# Altium footprint library PcbLib.PcbLib: 68 footprints (part 1 of 5)
Each footprint in its own frame and in the unit in brackets; x right, y up, seen from the top. Pads: shape width x height; smd on the part's side, far side on the other; paste and mask are expansions set on the pad; w line width, h text height; cw(c..) or ccw(c..) is an arc to the next point about the centre after c.
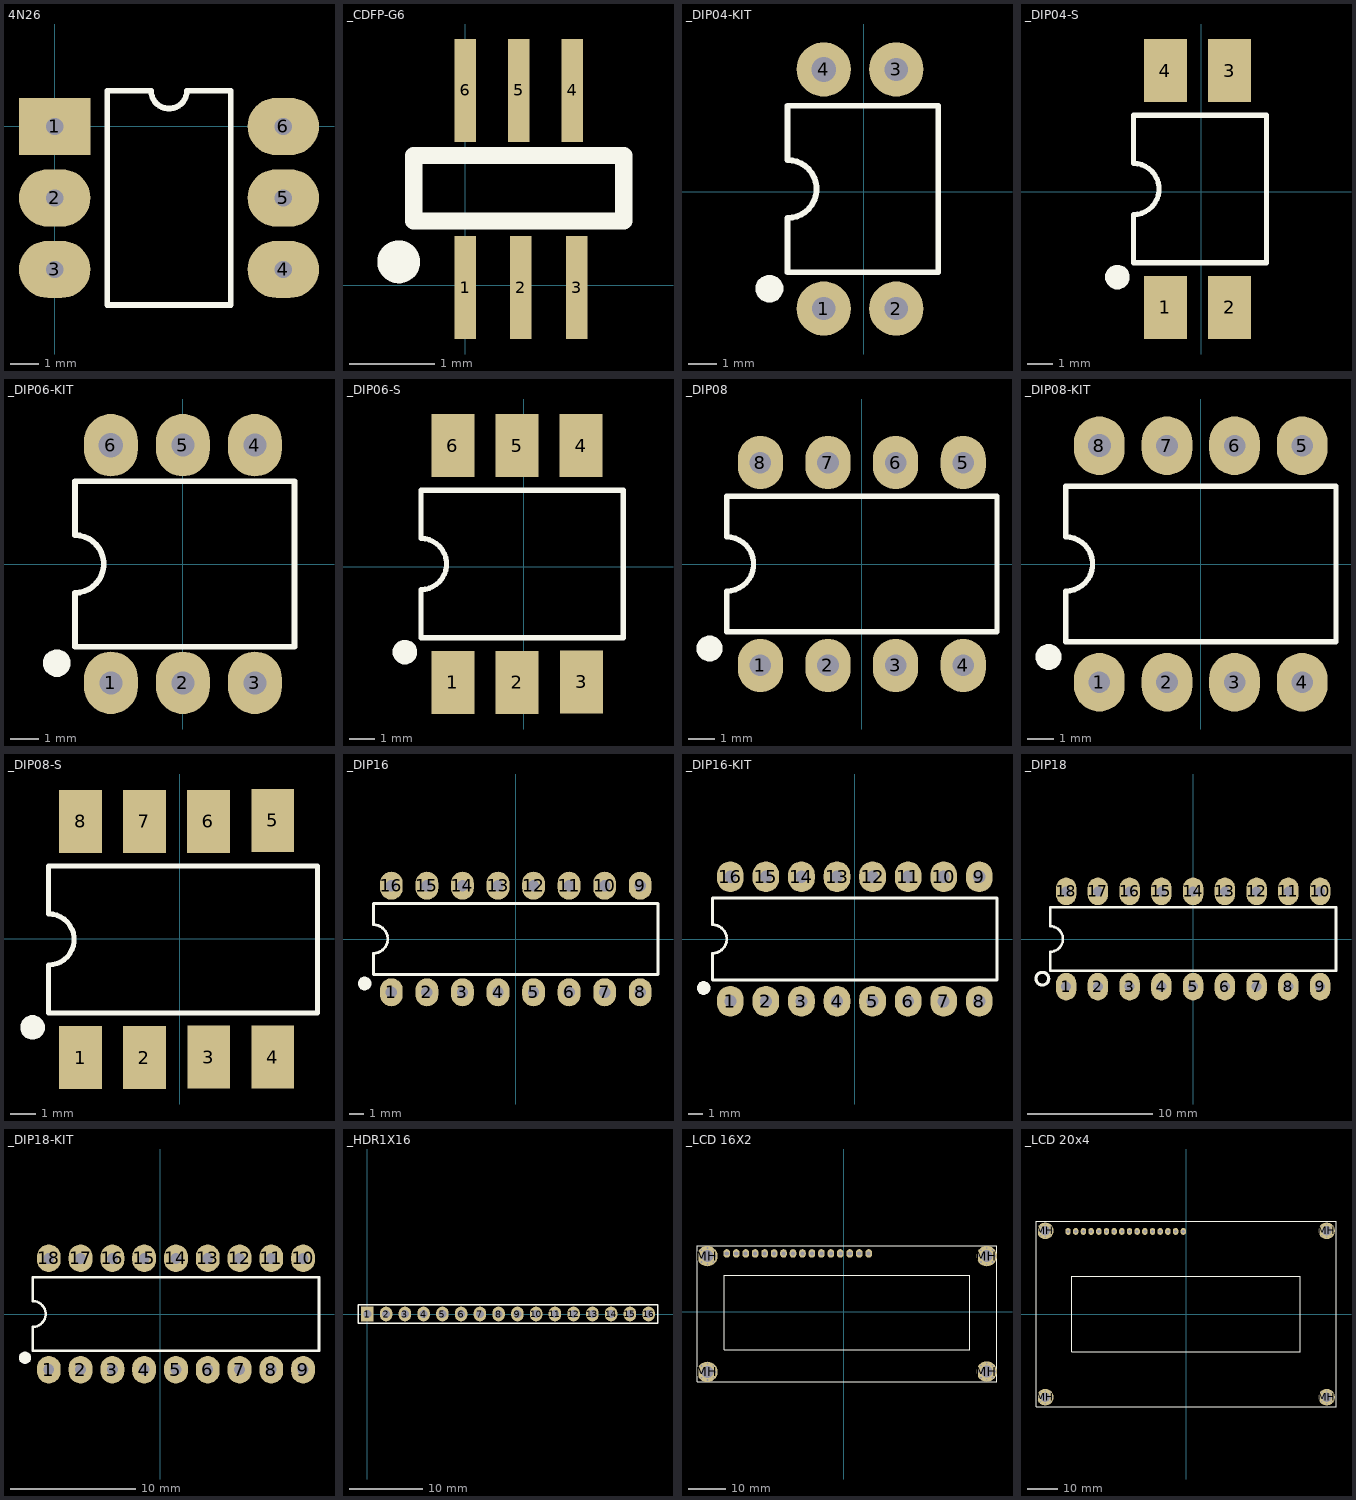
[diagram p0: the footprints below, top view; thin cyan lines are the x and y axes]

## 4N26 [mm]
pads (6):
  rect 2.5x2 hole 0.6: 1(0,0)
  oval 2.5x2 hole 0.6: 2(0,-2.5) 3(0,-5) 4(8,-5) 5(8,-2.5) 6(8,0)
Top Overlay:
  lines w0.2: 1.835,-6.25 1.835,1.25 3.375,1.25 ccw(c4,1.25) 4.625,1.25 6.165,1.25 6.165,-6.25 1.835,-6.25

## _CDFP-G6 [mm] "DFP; 6 Leads; Body 3.7 x 3.6 mm (LxW max); Pitch 1.27 mm"
height 1.8
pads (6):
  rect 0.25x1.2 smd: 1(0,-0.025) 2(0.65,-0.025) 3(1.3,-0.025) 4(1.25,2.275) 5(0.625,2.275) 6(0,2.275)
Top Overlay:
  circle w0.25: c-0.775,0.275 r0.125
  lines w0.2: -0.6,1.083 -0.6,1.516 1.85,1.516 1.85,0.75 -0.6,0.75 -0.6,1.225

## _DIP04-KIT [mm]
pads (4):
  round 1.905 hole 0.813: 1(-1.41,-4.091) 2(1.13,-4.091) 3(1.13,4.291)
  round 1.905 hole 0.864: 4(-1.41,4.291)
Top Overlay:
  region: -3.791,-3.393 -3.791,-3.298 -3.719,-3.123 -3.585,-2.989 -3.41,-2.916 -3.315,-2.916 -3.22,-2.916 -3.045,-2.989 -2.911,-3.123 -2.839,-3.298 -2.839,-3.393 -2.839,-3.487 -2.911,-3.662 -3.045,-3.796 -3.22,-3.869 -3.315,-3.869 -3.41,-3.869 -3.585,-3.796 -3.719,-3.662 -3.791,-3.487
  lines w0.203: -2.68,-2.821 2.6,-2.821 2.6,3.021 -2.68,3.021 -2.68,1.116 cw(c-2.68,0.1) -2.68,-0.916 -2.68,-2.821
Top Solder:
  circle w0: c1.13,-4.091 r0.432
  circle w0: c-1.41,-4.091 r0.432
  circle w0: c1.13,4.291 r0.432
  circle w0: c-1.41,4.291 r0.432
Bottom Solder:
  circle w0: c1.13,-4.091 r1.067
  circle w0: c-1.41,-4.091 r1.067
  circle w0: c1.13,4.291 r1.067
  circle w0: c-1.41,4.291 r1.067

## _DIP04-S [mm]
pads (4):
  rect 1.7x2.5 smd: 1(-1.41,-4.591) 2(1.13,-4.591) 3(1.13,4.791) 4(-1.41,4.791)
Top Overlay:
  region: -3.791,-3.393 -3.791,-3.298 -3.719,-3.123 -3.585,-2.989 -3.41,-2.916 -3.315,-2.916 -3.22,-2.916 -3.045,-2.989 -2.911,-3.123 -2.839,-3.298 -2.839,-3.393 -2.839,-3.487 -2.911,-3.662 -3.045,-3.796 -3.22,-3.869 -3.315,-3.869 -3.41,-3.869 -3.585,-3.796 -3.719,-3.662 -3.791,-3.487
  lines w0.203: -2.68,-2.821 -2.68,-0.916 ccw(c-2.68,0.1) -2.68,1.116 -2.68,3.021 2.6,3.021 2.6,-2.821 -2.68,-2.821
Top Solder:
  circle w0: c-1.41,4.791 r0.432
  circle w0: c1.13,4.791 r0.432
  circle w0: c-1.41,-4.591 r0.432
  circle w0: c1.13,-4.591 r0.432

## _DIP06-KIT [mil]
pads (6):
  oval 75x86.61 hole 32: 1(-100,-165) 2(0,-165) 3(100,-165) 4(100,165) 5(0,165)
  oval 75x86.61 hole 34: 6(-100,165)
Top Overlay:
  region: -193.75,-137.5 -193.75,-133.77 -190.9,-126.88 -185.62,-121.6 -178.73,-118.75 -175,-118.75 -171.27,-118.75 -164.38,-121.6 -159.1,-126.88 -156.25,-133.77 -156.25,-137.5 -156.25,-141.23 -159.1,-148.12 -164.38,-153.4 -171.27,-156.25 -175,-156.25 -178.73,-156.25 -185.62,-153.4 -190.9,-148.12 -193.75,-141.23
  lines w8: -150,-115 155,-115 155,115 -150,115 -150,40 cw(c-150,0) -150,-40 -150,-115
Top Solder:
  circle w0: c100,-165 r17
  circle w0: c0,-165 r17
  circle w0: c-100,-165 r17
  circle w0: c100,165 r17
  circle w0: c0,165 r17
  circle w0: c-100,165 r17
Bottom Solder:
  circle w0: c100,-165 r42
  circle w0: c0,-165 r42
  circle w0: c-100,-165 r42
  circle w0: c100,165 r42
  circle w0: c0,165 r42
  circle w0: c-100,165 r42

## _DIP06-S [mm]
pads (6):
  rect 1.7x2.5 smd: 1(-2.807,-4.591) 2(-0.267,-4.591) 3(2.286,-4.572) 4(2.273,4.791) 5(-0.267,4.791) 6(-2.807,4.791)
Top Overlay:
  region: -5.188,-3.393 -5.188,-3.298 -5.116,-3.123 -4.982,-2.989 -4.807,-2.916 -4.712,-2.916 -4.617,-2.916 -4.442,-2.989 -4.308,-3.123 -4.236,-3.298 -4.236,-3.393 -4.236,-3.487 -4.308,-3.662 -4.442,-3.796 -4.617,-3.869 -4.712,-3.869 -4.807,-3.869 -4.982,-3.796 -5.116,-3.662 -5.188,-3.487
  lines w0.203: -4.077,-2.821 3.937,-2.821 3.937,3.021 -4.077,3.021 -4.077,1.116 cw(c-4.077,0.1) -4.077,-0.916 -4.077,-2.821
Top Solder:
  circle w0: c-0.267,-4.591 r0.432
  circle w0: c-2.807,-4.591 r0.432
  circle w0: c-0.267,4.791 r0.432
  circle w0: c-2.807,4.791 r0.432

## _DIP08 [mm]
pads (8):
  oval 1.7x2 hole 0.813: 1(-3.81,-3.81) 2(-1.27,-3.81) 3(1.27,-3.81) 4(3.81,-3.81) 5(3.81,3.81) 6(1.27,3.81) 7(-1.27,3.81) 8(-3.81,3.81)
Top Overlay:
  region: -6.191,-3.175 -6.191,-3.08 -6.119,-2.905 -5.985,-2.771 -5.81,-2.699 -5.715,-2.699 -5.62,-2.699 -5.445,-2.771 -5.311,-2.905 -5.239,-3.08 -5.239,-3.175 -5.239,-3.27 -5.311,-3.445 -5.445,-3.579 -5.62,-3.651 -5.715,-3.651 -5.81,-3.651 -5.985,-3.579 -6.119,-3.445 -6.191,-3.27
  lines w0.203: -5.08,-2.54 5.08,-2.54 5.08,2.54 -5.08,2.54 -5.08,1.016 cw(c-5.08,0) -5.08,-1.016 -5.08,-2.54

## _DIP08-KIT [mm]
pads (8):
  oval 1.905x2.2 hole 0.813: 1(-3.81,-4.445) 2(-1.27,-4.445) 3(1.27,-4.445) 4(3.81,-4.445) 5(3.81,4.445) 6(1.27,4.445) 7(-1.27,4.445)
  oval 1.905x2.2 hole 0.864: 8(-3.81,4.445)
Top Overlay:
  region: -6.191,-3.492 -6.191,-3.398 -6.119,-3.223 -5.985,-3.089 -5.81,-3.016 -5.715,-3.016 -5.62,-3.016 -5.445,-3.089 -5.311,-3.223 -5.239,-3.398 -5.239,-3.492 -5.239,-3.587 -5.311,-3.762 -5.445,-3.896 -5.62,-3.969 -5.715,-3.969 -5.81,-3.969 -5.985,-3.896 -6.119,-3.762 -6.191,-3.587
  lines w0.203: -5.08,-2.921 5.08,-2.921 5.08,2.921 -5.08,2.921 -5.08,1.016 cw(c-5.08,0) -5.08,-1.016 -5.08,-2.921
Top Solder:
  circle w0: c3.81,-4.445 r0.432
  circle w0: c1.27,-4.445 r0.432
  circle w0: c-1.27,-4.445 r0.432
  circle w0: c-3.81,-4.445 r0.432
  circle w0: c3.81,4.445 r0.432
  circle w0: c1.27,4.445 r0.432
  circle w0: c-1.27,4.445 r0.432
  circle w0: c-3.81,4.445 r0.432
Bottom Solder:
  circle w0: c3.81,-4.445 r1.067
  circle w0: c1.27,-4.445 r1.067
  circle w0: c-1.27,-4.445 r1.067
  circle w0: c-3.81,-4.445 r1.067
  circle w0: c3.81,4.445 r1.067
  circle w0: c1.27,4.445 r1.067
  circle w0: c-1.27,4.445 r1.067
  circle w0: c-3.81,4.445 r1.067

## _DIP08-S [mm]
pads (8):
  rect 1.7x2.5 smd: 1(-3.95,-4.718) 2(-1.41,-4.718) 3(1.143,-4.699) 4(3.683,-4.699) 5(3.683,4.699) 6(1.13,4.664) 7(-1.41,4.664) 8(-3.95,4.664)
Top Overlay:
  region: -6.331,-3.52 -6.331,-3.425 -6.259,-3.25 -6.125,-3.116 -5.95,-3.043 -5.855,-3.043 -5.76,-3.043 -5.585,-3.116 -5.451,-3.25 -5.379,-3.425 -5.379,-3.52 -5.379,-3.614 -5.451,-3.789 -5.585,-3.923 -5.76,-3.996 -5.855,-3.996 -5.95,-3.996 -6.125,-3.923 -6.259,-3.789 -6.331,-3.614
  lines w0.203: -5.22,-2.948 5.461,-2.948 5.461,2.894 -5.22,2.894 -5.22,0.989 cw(c-5.22,-0.027) -5.22,-1.043 -5.22,-2.948
Top Solder:
  circle w0: c-1.41,-4.718 r0.432
  circle w0: c-3.95,-4.718 r0.432
  circle w0: c-1.41,4.664 r0.432
  circle w0: c-3.95,4.664 r0.432

## _DIP16 [mil]
pads (16):
  oval 64x78.74 hole 32: 1(-350,-150) 2(-250,-150) 3(-150,-150) 4(-50,-150) 5(50,-150) 6(150,-150) 7(250,-150) 8(350,-150) 9(350,150) 10(250,150) 11(150,150) 12(50,150) 13(-50,150) 14(-150,150) 15(-250,150) 16(-350,150)
Top Overlay:
  region: -443.75,-125 -443.75,-121.27 -440.9,-114.38 -435.62,-109.1 -428.73,-106.25 -425,-106.25 -421.27,-106.25 -414.38,-109.1 -409.1,-114.38 -406.25,-121.27 -406.25,-125 -406.25,-128.73 -409.1,-135.62 -414.38,-140.9 -421.27,-143.75 -425,-143.75 -428.73,-143.75 -435.62,-140.9 -440.9,-135.62 -443.75,-128.73
  lines w8: -400,-100 400,-100 400,100 -400,100 -400,40 cw(c-400,0) -400,-40 -400,-100

## _DIP16-KIT [mm]
pads (16):
  oval 1.905x2.2 hole 0.864: 1(-8.89,-4.445) 2(-6.35,-4.445) 3(-3.81,-4.445) 4(-1.27,-4.445) 5(1.27,-4.445) 6(3.81,-4.445) 7(6.35,-4.445) 8(8.89,-4.445) 9(8.89,4.445) 10(6.35,4.445) 11(3.81,4.445) 12(1.27,4.445) 13(-1.27,4.445) 14(-3.81,4.445) 15(-6.35,4.445) 16(-8.89,4.445)
Top Overlay:
  region: -11.271,-3.492 -11.271,-3.398 -11.199,-3.223 -11.065,-3.089 -10.89,-3.016 -10.795,-3.016 -10.7,-3.016 -10.525,-3.089 -10.391,-3.223 -10.319,-3.398 -10.319,-3.492 -10.319,-3.587 -10.391,-3.762 -10.525,-3.896 -10.7,-3.969 -10.795,-3.969 -10.89,-3.969 -11.065,-3.896 -11.199,-3.762 -11.271,-3.587
  lines w0.203: -10.16,-2.921 -10.16,-1.016 ccw(c-10.16,0) -10.16,1.016 -10.16,2.921 10.16,2.921 10.16,-2.921 -10.16,-2.921
Top Solder:
  circle w0: c-3.81,4.445 r0.432
  circle w0: c-1.27,4.445 r0.432
  circle w0: c1.27,4.445 r0.432
  circle w0: c3.81,4.445 r0.432
  circle w0: c6.35,4.445 r0.432
  circle w0: c8.89,4.445 r0.432
  circle w0: c8.89,-4.445 r0.432
  circle w0: c-6.35,-4.445 r0.432
  circle w0: c-3.81,-4.445 r0.432
  circle w0: c-1.27,-4.445 r0.432
  circle w0: c1.27,-4.445 r0.432
  circle w0: c3.81,-4.445 r0.432
  circle w0: c6.35,-4.445 r0.432
  circle w0: c-8.89,-4.445 r0.432
  circle w0: c-3.81,4.445 r0.432
  circle w0: c-3.81,4.445 r0.432
  circle w0: c-6.35,4.445 r0.432
  circle w0: c-8.89,4.445 r0.432
Bottom Solder:
  circle w0: c-3.81,4.445 r1.067
  circle w0: c-1.27,4.445 r1.067
  circle w0: c1.27,4.445 r1.067
  circle w0: c3.81,4.445 r1.067
  circle w0: c6.35,4.445 r1.067
  circle w0: c8.89,4.445 r1.067
  circle w0: c8.89,-4.445 r1.067
  circle w0: c3.81,-4.445 r1.067
  circle w0: c6.35,-4.445 r1.067
  circle w0: c1.27,-4.445 r1.067
  circle w0: c-1.27,-4.445 r1.067
  circle w0: c-3.81,-4.445 r1.067
  circle w0: c-6.35,-4.445 r1.067
  circle w0: c-8.89,-4.445 r1.067
  circle w0: c-6.35,4.445 r1.067
  circle w0: c-8.89,4.445 r1.067

## _DIP18 [mil]
pads (18):
  oval 64x86.61 hole 32: 1(-400,-150) 2(-300,-150) 3(-200,-150) 4(-100,-150) 5(0,-150) 6(100,-150) 7(200,-150) 8(300,-150) 9(400,-150) 10(400,150) 11(300,150) 12(200,150) 13(100,150) 14(0,150) 15(-100,150) 16(-200,150) 17(-300,150) 18(-400,150)
Top Overlay:
  circle w10: c-475,-125 r20
  lines w8: -450,-100 -450,-40 ccw(c-450,0) -450,40 -450,100 450,100 450,-100 -450,-100

## _DIP18-KIT [mm]
pads (18):
  oval 1.905x2.2 hole 0.864: 1(-8.89,-4.445) 2(-6.35,-4.445) 3(-3.81,-4.445) 4(-1.27,-4.445) 5(1.27,-4.445) 6(3.81,-4.445) 7(6.35,-4.445) 8(8.89,-4.445) 9(11.43,-4.445) 10(11.43,4.445) 11(8.89,4.445) 12(6.35,4.445) 13(3.81,4.445) 14(1.27,4.445) 15(-1.27,4.445) 16(-3.81,4.445) 17(-6.35,4.445) 18(-8.89,4.445)
Top Overlay:
  region: -11.271,-3.492 -11.271,-3.398 -11.199,-3.223 -11.065,-3.089 -10.89,-3.016 -10.795,-3.016 -10.7,-3.016 -10.525,-3.089 -10.391,-3.223 -10.319,-3.398 -10.319,-3.492 -10.319,-3.587 -10.391,-3.762 -10.525,-3.896 -10.7,-3.969 -10.795,-3.969 -10.89,-3.969 -11.065,-3.896 -11.199,-3.762 -11.271,-3.587
  lines w0.203: -10.16,-2.921 12.7,-2.921 12.7,2.921 -10.16,2.921 -10.16,1.016 cw(c-10.16,0) -10.16,-1.016 -10.16,-2.921
Top Solder:
  circle w0: c-8.89,4.445 r0.432
  circle w0: c-6.35,4.445 r0.432
  circle w0: c-3.81,4.445 r0.432
  circle w0: c-3.81,4.445 r0.432
  circle w0: c-8.89,-4.445 r0.432
  circle w0: c6.35,-4.445 r0.432
  circle w0: c3.81,-4.445 r0.432
  circle w0: c1.27,-4.445 r0.432
  circle w0: c-1.27,-4.445 r0.432
  circle w0: c-3.81,-4.445 r0.432
  circle w0: c-6.35,-4.445 r0.432
  circle w0: c8.89,-4.445 r0.432
  circle w0: c8.89,4.445 r0.432
  circle w0: c6.35,4.445 r0.432
  circle w0: c3.81,4.445 r0.432
  circle w0: c1.27,4.445 r0.432
  circle w0: c-1.27,4.445 r0.432
  circle w0: c-3.81,4.445 r0.432
  circle w0: c11.43,4.445 r0.432
  circle w0: c11.43,-4.445 r0.432
Bottom Solder:
  circle w0: c-8.89,4.445 r1.067
  circle w0: c-6.35,4.445 r1.067
  circle w0: c-8.89,-4.445 r1.067
  circle w0: c-6.35,-4.445 r1.067
  circle w0: c-3.81,-4.445 r1.067
  circle w0: c-1.27,-4.445 r1.067
  circle w0: c1.27,-4.445 r1.067
  circle w0: c6.35,-4.445 r1.067
  circle w0: c3.81,-4.445 r1.067
  circle w0: c8.89,-4.445 r1.067
  circle w0: c8.89,4.445 r1.067
  circle w0: c6.35,4.445 r1.067
  circle w0: c3.81,4.445 r1.067
  circle w0: c1.27,4.445 r1.067
  circle w0: c-1.27,4.445 r1.067
  circle w0: c-3.81,4.445 r1.067
  circle w0: c11.43,4.445 r1.067
  circle w0: c11.43,-4.445 r1.067

## _HDR1X16 [mm] "Connector; Header; 16 Position"
pads (16):
  rect 1.7x2 hole 1.1: 1(0,0)
  oval 1.7x2 hole 1.1: 2(2.54,0) 3(5.08,0) 4(7.62,0) 5(10.16,0) 6(12.7,0) 7(15.24,0) 8(17.78,0) 9(20.32,0) 10(22.86,0) 11(25.4,0) 12(27.94,0) 13(30.48,0) 14(33.02,0) 15(35.56,0) 16(38.1,0)
Top Overlay:
  lines w0.2: -1.27,-1.27 39.37,-1.27 39.37,1.27 0.635,1.27 -1.27,1.27 -1.27,-1.27

## _LCD 16X2 [mm]
pads (52):
  oval 1.778x2.286 hole 1.1: 1(-31.445,15.672) 2(-28.905,15.672) 3(-26.365,15.672) 4(-23.825,15.672) 5(-21.285,15.672) 6(-18.745,15.672) 7(-16.205,15.672) 8(-13.665,15.672) 9(-11.125,15.672) 10(-8.585,15.672) 11(-6.045,15.672) 12(-3.505,15.672) 13(-0.965,15.672) 14(1.575,15.672) 15(4.115,15.672) 16(6.655,15.672)
  round 0.6 hole 0.5: MH(-38.845,-16.128) MH(-38.845,14.972) MH(-38.201,-17.684) MH(-38.201,-14.573) MH(-38.201,13.416) MH(-38.201,16.527) MH(-36.645,-18.328) MH(-36.645,-13.928) MH(-36.645,12.772) MH(-36.645,17.172) MH(-35.09,-17.684) MH(-35.09,-14.573) MH(-35.09,13.416) MH(-35.09,16.527) MH(-34.445,-16.128) MH(-34.445,14.972) MH(36.155,-16.028) MH(36.155,14.972) MH(36.799,-17.584) MH(36.799,-14.473) MH(36.799,13.416) MH(36.799,16.527) MH(38.355,-18.228) MH(38.355,-13.828) MH(38.355,12.772) MH(38.355,17.172) MH(39.91,-17.584) MH(39.91,-14.473) MH(39.91,13.416) MH(39.91,16.527) MH(40.555,-16.028) MH(40.555,14.972)
  round 5.5 hole 3.2: MH(-36.645,-16.128) MH(-36.645,14.972) MH(38.355,-16.028) MH(38.355,14.972)
Top Overlay:
  lines w0.254: -39.437,-18.796 -39.437,17.704 41.063,17.704 41.063,-18.796 -39.437,-18.796 ; -32.145,-10.228 -32.145,9.772 33.855,9.772 33.855,-10.228 -32.145,-10.228

## _LCD 20x4 [mm]
pads (52):
  oval 1.778x2.286 hole 1.016: 1(-39,27.3) 2(-36.46,27.3) 3(-33.92,27.3) 4(-31.38,27.3) 5(-28.84,27.3) 6(-26.3,27.3) 7(-23.76,27.3) 8(-21.22,27.3) 9(-18.68,27.3) 10(-16.14,27.3) 11(-13.6,27.3) 12(-11.06,27.3) 13(-8.52,27.3) 14(-5.98,27.3) 15(-3.44,27.3) 16(-0.9,27.3)
  round 1 hole 0.5: MH(-48.7,-27.5) MH(-48.7,27.5) MH(-48.056,-29.056) MH(-48.056,-25.944) MH(-48.056,25.944) MH(-48.056,29.056) MH(-46.5,-29.7) MH(-46.5,-25.3) MH(-46.5,25.3) MH(-46.5,29.7) MH(-44.944,-29.056) MH(-44.944,-25.944) MH(-44.944,25.944) MH(-44.944,29.056) MH(-44.3,-27.5) MH(-44.3,27.5) MH(44.3,-27.5) MH(44.3,27.5) MH(44.944,-29.056) MH(44.944,-25.944) MH(44.944,25.944) MH(44.944,29.056) MH(46.5,-29.7) MH(46.5,-25.3) MH(46.5,25.3) MH(46.5,29.7) MH(48.056,-29.056) MH(48.056,-25.944) MH(48.056,25.944) MH(48.056,29.056) MH(48.7,-27.5) MH(48.7,27.5)
  round 5.5 hole 3.2: MH(-46.5,-27.5) MH(-46.5,27.5) MH(46.5,-27.5) MH(46.5,27.5)
Top Overlay:
  lines w0.254: -49.6,-30.6 49.6,-30.6 49.6,30.6 -49.6,30.6 -49.6,-30.6 ; -37.8,-12.5 37.8,-12.5 37.8,12.5 -37.8,12.5 -37.8,-12.5
3D body "14801-15 H.STEP": height 18.71, standoff -3.71, extent -48.8,25.2 -44.2,29.8
3D body "14801-15 H.STEP": height 18.71, standoff -3.71, extent -48.8,-29.8 -44.2,-25.2
3D body "14801-15 H.STEP": height 18.71, standoff -3.71, extent 44.2,-29.8 48.8,-25.2
3D body "14801-15 H.STEP": height 18.71, standoff -3.71, extent 44.2,25.2 48.8,29.8